# Altium footprint library ICs And Semiconductors SMD.PcbLib: 943 footprints (part 9 of 60)
Each footprint in its own frame and in the unit in brackets; x right, y up, seen from the top. Pads: shape width x height; smd on the part's side, far side on the other; paste and mask are expansions set on the pad; w line width, h text height; cw(c..) or ccw(c..) is an arc to the next point about the centre after c.
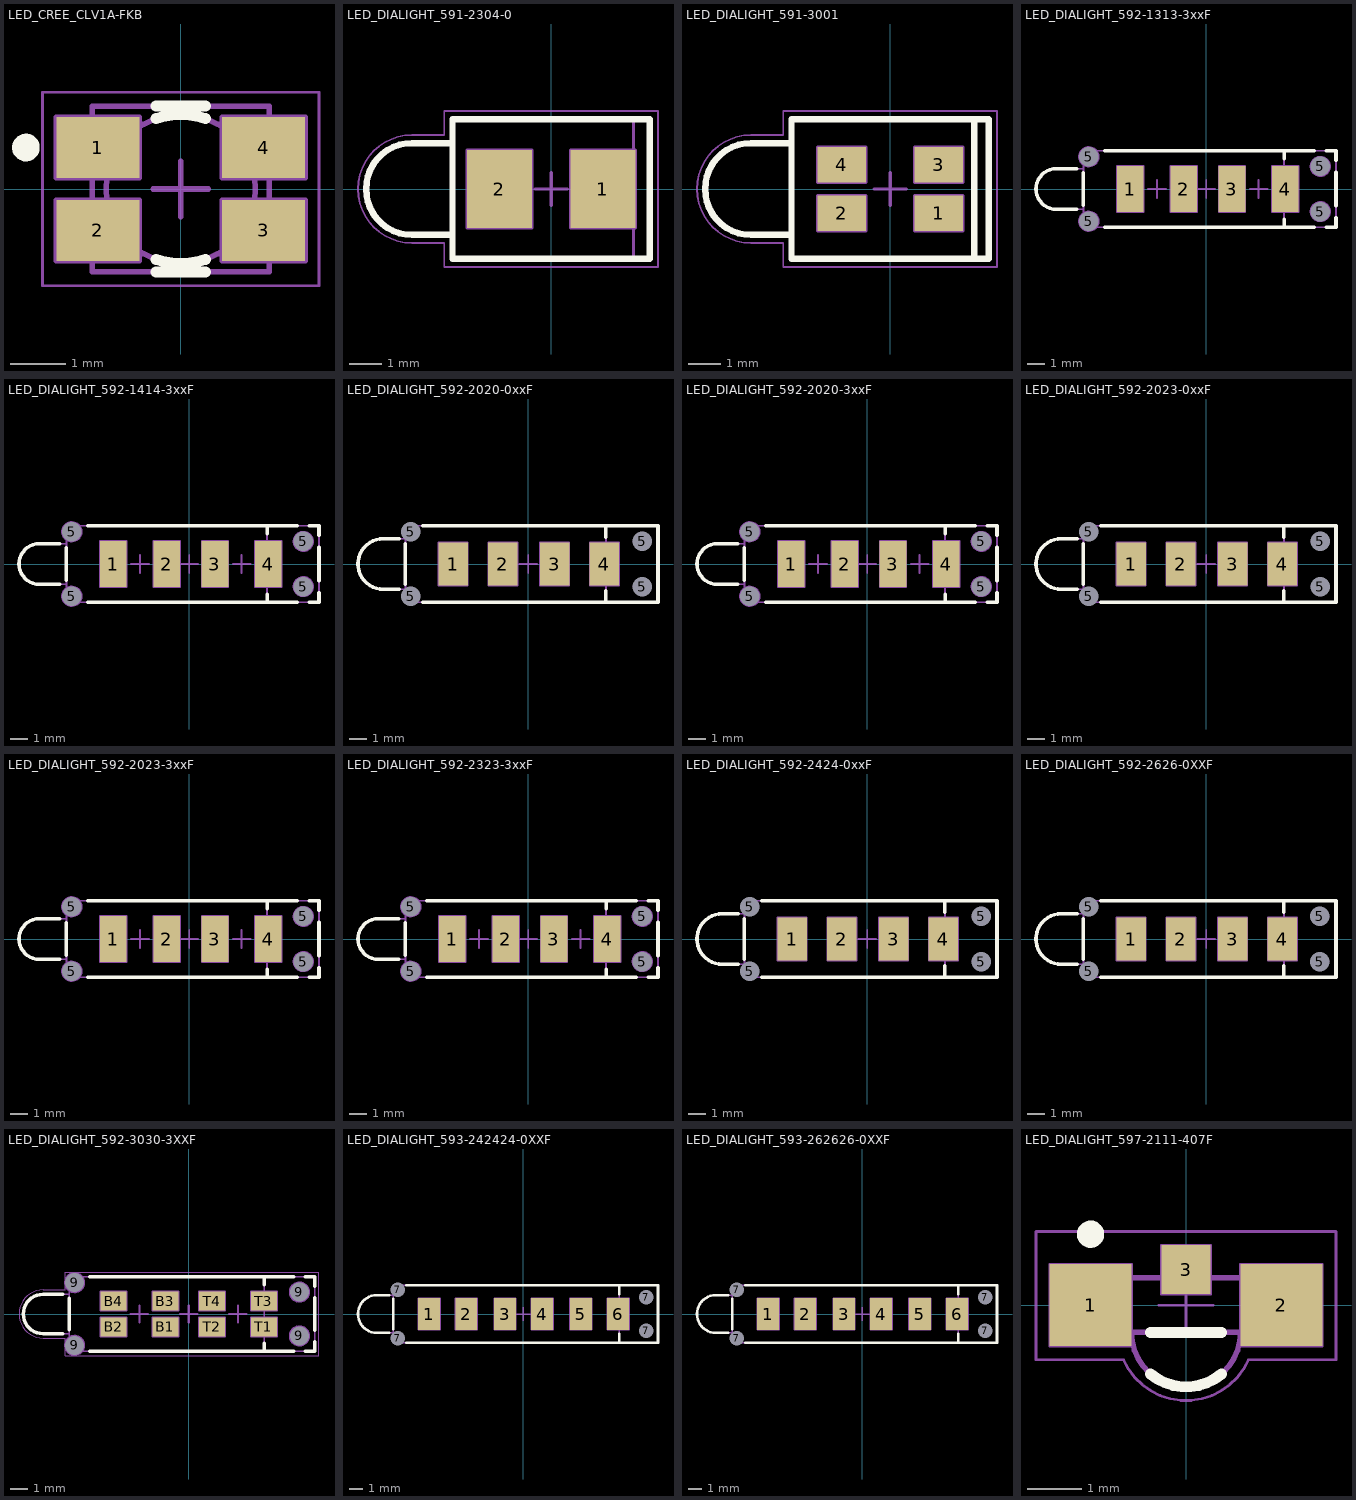
[diagram p8: the footprints below, top view; thin cyan lines are the x and y axes]

## LED_CREE_CLV1A-FKB [mm] "PLCC4 3 in 1 Surface Mount Red/Green/Blue LED With Black Top Surface, Body 3.2mm X 2.8mm"
height 2.1
pads (4):
  rect 1.5x1.1 smd: 1(-1.5,0.75) 2(-1.5,-0.75) 3(1.5,-0.75) 4(1.5,0.75)
Top Overlay:
  circle w0.25: c-2.8,0.75 r0.125
  lines w0.2: -0.45,-1.5 0.45,-1.5 ; -0.45,-1.273 ccw(c0,0) 0.45,-1.273 ; -0.45,1.273 cw(c0,0) 0.45,1.273 ; -0.45,1.5 0.45,1.5
Mechanical 8:
  lines w0.1: -2,-0.75 -1.5,-0.75 ; -2,0.75 -1.5,0.75 ; -1.5,-1.25 -1.5,-0.75 ; -1.5,-0.25 -1.5,-0.75 ; -1.5,0.25 -1.5,0.75 ; -1.5,1.25 -1.5,0.75 ; -1,-0.75 -1.5,-0.75 ; -1,0.75 -1.5,0.75 ; -0.5,0 0,0 ; 0,-0.5 0,0 ; 0,0.5 0,0 ; 0.5,0 0,0 ; 1,-0.75 1.5,-0.75 ; 1,0.75 1.5,0.75 ; 1.5,-1.25 1.5,-0.75 ; 1.5,-0.25 1.5,-0.75 ; 1.5,0.25 1.5,0.75 ; 1.5,1.25 1.5,0.75 ; 2,-0.75 1.5,-0.75 ; 2,0.75 1.5,0.75 ; -2.25,-1.3 -0.75,-1.3 -0.75,-0.2 -2.25,-0.2 -2.25,-1.3 ; -2.25,0.2 -0.75,0.2 -0.75,1.3 -2.25,1.3 -2.25,0.2 ; 0.75,-1.3 2.25,-1.3 2.25,-0.2 0.75,-0.2 0.75,-1.3 ; 0.75,0.2 2.25,0.2 2.25,1.3 0.75,1.3 0.75,0.2
Mechanical 14:
  circle w0.1: c0,0 r1.35
  lines w0.1: -1.6,-1.1 -1.85,-1.1 -1.85,-0.4 -1.6,-0.4 ; -1.6,0.4 -1.85,0.4 -1.85,1.1 -1.6,1.1 ; 1.6,-1.1 1.85,-1.1 1.85,-0.4 1.6,-0.4 ; 1.6,0.4 1.85,0.4 1.85,1.1 1.6,1.1 ; -1.6,-1.5 1.6,-1.5 1.6,1.5 -1.6,1.5 -1.6,-1.5
Mechanical 15:
  lines w0.05: -2.5,-1.75 -2.5,1.75 2.5,1.75 2.5,-1.75 -2.5,-1.75
3D body "CREE_CLV1A-FKB.stp": height 2.1, standoff 0, extent -1.85,-1.5 1.85,1.5

## LED_DIALIGHT_591-2304-0 [mm] "Surface Mount Green LED, Body 6.1mm X4.32mm"
height 5.26
pads (2):
  rect 2x2.4 smd: 1(1.6,0) 2(-1.6,0)
Top Overlay:
  lines w0.2: -3.05,-1.42 -4.3,-1.42 cw(c-4.3,0) -4.3,1.42 -3.05,1.42 ; -3.05,-2.16 3.05,-2.16 3.05,2.16 -3.05,2.16 -3.05,-2.16
Mechanical 8:
  lines w0.1: -2.1,0 -1.6,0 ; -1.6,-0.5 -1.6,0 ; -1.6,0.5 -1.6,0 ; -1.1,0 -1.6,0 ; -0.5,0 0,0 ; 0,-0.5 0,0 ; 0,0.5 0,0 ; 0.5,0 0,0 ; 1.1,0 1.6,0 ; 1.6,-0.5 1.6,0 ; 1.6,0.5 1.6,0 ; 2.1,0 1.6,0 ; -2.6,-1.2 -0.6,-1.2 -0.6,1.2 -2.6,1.2 -2.6,-1.2 ; 0.6,-1.2 2.6,-1.2 2.6,1.2 0.6,1.2 0.6,-1.2
Mechanical 14:
  lines w0.1: -3.05,-1.42 -4.3,-1.42 cw(c-4.3,0) -4.3,1.42 -3.05,1.42 ; 2.542,-2.16 2.542,2.16 ; -3.05,-2.16 3.05,-2.16 3.05,2.16 -3.05,2.16 -3.05,-2.16
Mechanical 15:
  lines w0.05: -4.3,-1.67 cw(c-4.3,0) -4.3,1.67 -3.3,1.67 -3.3,2.41 3.3,2.41 3.3,-2.41 -3.3,-2.41 -3.3,-1.67 -4.3,-1.67
3D body "LED_DIALIGHT_591-2304-0.stp": height 5.26, standoff 0, extent -5.72,-2.16 3.05,2.16

## LED_DIALIGHT_591-3001 [mm] "Surface Mount Red/Green LED, Body 6.1mm X4.32mm"
height 5.26
pads (4):
  rect 1.5x1.09 smd: 1(1.5,-0.75) 2(-1.5,-0.75) 3(1.5,0.75) 4(-1.5,0.75)
Top Overlay:
  lines w0.2: -3.05,-1.42 -4.3,-1.42 cw(c-4.3,0) -4.3,1.42 -3.05,1.42 ; 2.592,-2.16 2.592,2.16 ; -3.05,-2.16 3.05,-2.16 3.05,2.16 -3.05,2.16 -3.05,-2.16
Mechanical 8:
  lines w0.1: -2,-0.75 -1.5,-0.75 ; -2,0.75 -1.5,0.75 ; -1.5,-1.25 -1.5,-0.75 ; -1.5,-0.25 -1.5,-0.75 ; -1.5,0.25 -1.5,0.75 ; -1.5,1.25 -1.5,0.75 ; -1,-0.75 -1.5,-0.75 ; -1,0.75 -1.5,0.75 ; -0.5,0 0,0 ; 0,-0.5 0,0 ; 0,0.5 0,0 ; 0.5,0 0,0 ; 1,-0.75 1.5,-0.75 ; 1,0.75 1.5,0.75 ; 1.5,-1.25 1.5,-0.75 ; 1.5,-0.25 1.5,-0.75 ; 1.5,0.25 1.5,0.75 ; 1.5,1.25 1.5,0.75 ; 2,-0.75 1.5,-0.75 ; 2,0.75 1.5,0.75 ; 2.25,-1.295 2.25,-0.205 ; 2.25,-1.295 0.75,-1.295 0.75,-0.205 2.25,-0.205 ; 2.25,-1.295 2.25,-0.205 ; 2.25,0.205 2.25,1.295 ; 2.25,0.205 0.75,0.205 0.75,1.295 2.25,1.295 ; 2.25,0.205 2.25,1.295 ; -2.25,-1.295 -2.25,-0.205 -0.75,-0.205 -0.75,-1.295 -2.25,-1.295 ; -2.25,0.205 -0.75,0.205 -0.75,1.295 -2.25,1.295 -2.25,0.205
Mechanical 14:
  lines w0.1: -3.05,-1.42 -4.3,-1.42 cw(c-4.3,0) -4.3,1.42 -3.05,1.42 ; 2.542,-2.16 2.542,2.16 ; -3.05,-2.16 3.05,-2.16 3.05,2.16 -3.05,2.16 -3.05,-2.16
Mechanical 15:
  lines w0.05: -4.3,-1.67 cw(c-4.3,0) -4.3,1.67 -3.3,1.67 -3.3,2.41 3.3,2.41 3.3,-2.41 -3.3,-2.41 -3.3,-1.67 -4.3,-1.67
3D body "LED_DIALIGHT_591-3001.stp": height 5.26, standoff 0, extent -5.72,-2.16 3.05,2.16

## LED_DIALIGHT_592-1313-3xxF [mm] "3mm Bi-Level (Top: Green, Bot: Green) Prism CBI Bi-color Surface Mount LED 592 Serie"
height 10.29
pads (8):
  rect 1.5x2.59 smd: 1(-4.275,0) 2(-1.275,0) 3(1.445,0) 4(4.445,0)
  round 1 hole 1.1 unplated mask+0.05: 5(-6.615,-1.815) 5(-6.615,1.815) 5(6.415,-1.27) 5(6.415,1.27)
Top Overlay:
  lines w0.2: -7.287,-1.143 -8.446,-1.143 cw(c-8.446,0) -8.446,1.143 -7.287,1.143 ; -6.922,-0.916 -6.922,0.916 ; -5.729,-2.159 6.08,-2.159 ; -5.729,2.159 6.08,2.159 ; 4.382,-2.159 4.382,-1.695 ; 4.382,1.695 4.382,2.159 ; 6.75,-2.159 7.303,-2.159 7.303,-1.609 ; 6.75,2.159 7.303,2.159 7.303,1.609 ; 7.303,-0.931 7.303,0.931
Mechanical 8:
  circle w0.1: c-6.615,1.815 r0.55
  circle w0.1: c-6.615,-1.815 r0.55
  circle w0.1: c6.415,-1.27 r0.55
  circle w0.1: c6.415,1.27 r0.55
  lines w0.1: -7.115,-1.815 -6.615,-1.815 ; -7.115,1.815 -6.615,1.815 ; -6.615,-2.315 -6.615,-1.815 ; -6.615,-1.315 -6.615,-1.815 ; -6.615,1.315 -6.615,1.815 ; -6.615,2.315 -6.615,1.815 ; -6.115,-1.815 -6.615,-1.815 ; -6.115,1.815 -6.615,1.815 ; -4.275,-0.5 -4.275,0 ; -4.275,0.5 -4.275,0 ; -2.775,-0.5 -2.775,0 ; -2.775,0.5 -2.775,0 ; -1.275,-0.5 -1.275,0 ; -1.275,0.5 -1.275,0 ; -0.5,0 0,0 ; 0,-0.5 0,0 ; 0,0.5 0,0 ; 0.5,0 0,0 ; 1.445,-0.5 1.445,0 ; 1.445,0.5 1.445,0 ; 2.945,-0.5 2.945,0 ; 2.945,0.5 2.945,0 ; 4.445,-0.5 4.445,0 ; 4.445,0.5 4.445,0 ; 5.915,-1.27 6.415,-1.27 ; 5.915,1.27 6.415,1.27 ; 6.415,-1.77 6.415,-1.27 ; 6.415,-0.77 6.415,-1.27 ; 6.415,0.77 6.415,1.27 ; 6.415,1.77 6.415,1.27 ; 6.915,-1.27 6.415,-1.27 ; 6.915,1.27 6.415,1.27 ; -4.275,0 -4.775,0 -4.275,0 ; -4.275,0 -3.775,0 -4.275,0 ; -2.775,0 -3.275,0 -2.775,0 ; -2.775,0 -2.275,0 -2.775,0 ; -1.275,0 -1.775,0 -1.275,0 ; -1.275,0 -0.775,0 -1.275,0 ; 1.445,0 0.945,0 1.445,0 ; 1.445,0 1.945,0 1.445,0 ; 2.945,0 2.445,0 2.945,0 ; 2.945,0 3.445,0 2.945,0 ; 4.445,0 3.945,0 4.445,0 ; 4.445,0 4.945,0 4.445,0 ; -5.025,-1.295 -3.525,-1.295 -3.525,1.295 -5.025,1.295 -5.025,-1.295 ; -2.025,-1.295 -0.525,-1.295 -0.525,1.295 -2.025,1.295 -2.025,-1.295 ; 0.695,-1.295 2.195,-1.295 2.195,1.295 0.695,1.295 0.695,-1.295 ; 3.695,-1.295 5.195,-1.295 5.195,1.295 3.695,1.295 3.695,-1.295
Mechanical 14:
  lines w0.1: -6.922,-1.143 -8.446,-1.143 cw(c-8.446,0) -8.446,1.143 -6.922,1.143 ; 4.382,-2.159 4.382,2.159 ; -6.922,-2.159 7.303,-2.159 7.303,2.159 -6.922,2.159 -6.922,-2.159
3D body "LED_DIALIGHT_592-3030-3xxF.stp": height 10.41, standoff -1.14, extent -9.588,-2.159 7.303,2.159

## LED_DIALIGHT_592-1414-3xxF [mm] "3mm Bi-Level (Top: Yelow, Bot: Yelow) Prism CBI Bi-color Surface Mount LED 592 Serie"
height 10.29
pads (8):
  rect 1.5x2.59 smd: 1(-4.275,0) 2(-1.275,0) 3(1.445,0) 4(4.445,0)
  round 1 hole 1.1 unplated mask+0.05: 5(-6.615,-1.815) 5(-6.615,1.815) 5(6.415,-1.27) 5(6.415,1.27)
Top Overlay:
  lines w0.2: -7.287,-1.143 -8.446,-1.143 cw(c-8.446,0) -8.446,1.143 -7.287,1.143 ; -6.922,-0.916 -6.922,0.916 ; -5.729,-2.159 6.08,-2.159 ; -5.729,2.159 6.08,2.159 ; 4.382,-2.159 4.382,-1.695 ; 4.382,1.695 4.382,2.159 ; 6.75,-2.159 7.303,-2.159 7.303,-1.609 ; 6.75,2.159 7.303,2.159 7.303,1.609 ; 7.303,-0.931 7.303,0.931
Mechanical 8:
  circle w0.1: c6.415,1.27 r0.55
  circle w0.1: c6.415,-1.27 r0.55
  circle w0.1: c-6.615,-1.815 r0.55
  circle w0.1: c-6.615,1.815 r0.55
  lines w0.1: -7.115,-1.815 -6.615,-1.815 ; -7.115,1.815 -6.615,1.815 ; -6.615,-2.315 -6.615,-1.815 ; -6.615,-1.315 -6.615,-1.815 ; -6.615,1.315 -6.615,1.815 ; -6.615,2.315 -6.615,1.815 ; -6.115,-1.815 -6.615,-1.815 ; -6.115,1.815 -6.615,1.815 ; -4.275,-0.5 -4.275,0 ; -4.275,0.5 -4.275,0 ; -2.775,-0.5 -2.775,0 ; -2.775,0.5 -2.775,0 ; -1.275,-0.5 -1.275,0 ; -1.275,0.5 -1.275,0 ; -0.5,0 0,0 ; 0,-0.5 0,0 ; 0,0.5 0,0 ; 0.5,0 0,0 ; 1.445,-0.5 1.445,0 ; 1.445,0.5 1.445,0 ; 2.945,-0.5 2.945,0 ; 2.945,0.5 2.945,0 ; 4.445,-0.5 4.445,0 ; 4.445,0.5 4.445,0 ; 5.915,-1.27 6.415,-1.27 ; 5.915,1.27 6.415,1.27 ; 6.415,-1.77 6.415,-1.27 ; 6.415,-0.77 6.415,-1.27 ; 6.415,0.77 6.415,1.27 ; 6.415,1.77 6.415,1.27 ; 6.915,-1.27 6.415,-1.27 ; 6.915,1.27 6.415,1.27 ; -4.275,0 -3.775,0 -4.275,0 ; -4.275,0 -4.775,0 -4.275,0 ; -2.775,0 -2.275,0 -2.775,0 ; -2.775,0 -3.275,0 -2.775,0 ; -1.275,0 -0.775,0 -1.275,0 ; -1.275,0 -1.775,0 -1.275,0 ; 1.445,0 1.945,0 1.445,0 ; 1.445,0 0.945,0 1.445,0 ; 2.945,0 3.445,0 2.945,0 ; 2.945,0 2.445,0 2.945,0 ; 4.445,0 4.945,0 4.445,0 ; 4.445,0 3.945,0 4.445,0 ; -5.025,-1.295 -5.025,1.295 -3.525,1.295 -3.525,-1.295 -5.025,-1.295 ; -2.025,-1.295 -2.025,1.295 -0.525,1.295 -0.525,-1.295 -2.025,-1.295 ; 0.695,-1.295 0.695,1.295 2.195,1.295 2.195,-1.295 0.695,-1.295 ; 3.695,-1.295 3.695,1.295 5.195,1.295 5.195,-1.295 3.695,-1.295
Mechanical 14:
  lines w0.1: -6.922,-1.143 -8.446,-1.143 cw(c-8.446,0) -8.446,1.143 -6.922,1.143 ; 4.382,-2.159 4.382,2.159 ; -6.922,-2.159 -6.922,2.159 7.303,2.159 7.303,-2.159 -6.922,-2.159
3D body "LED_DIALIGHT_592-1414-3xxF.stp": height 10.41, standoff -1.14, extent -9.588,-2.159 7.303,2.159

## LED_DIALIGHT_592-2020-0xxF [mil] "3mm Bi-Level (Top: HeRed, Bot: HeRed) Prism CBI Bi-color Surface Mount LED 592 Serie"
height 389.76
pads (8):
  rect 65x95 smd: 1(-166.5,0) 2(-56.5,0) 3(58.5,0) 4(168.5,0)
  round 39.37 hole 43.31 unplated mask+1.97: 5(-260.5,-71.5) 5(-260.5,71.5) 5(252.49,-50) 5(252.49,50)
Top Overlay:
  lines w7.87: -285.63,-56 -321.5,-56 cw(c-321.5,0) -321.5,56 -285.63,56 ; -272.5,-44.52 -272.5,44.52 ; -234.24,-85 287.5,-85 287.5,85 -234.24,85 ; 172.03,-85 172.03,-59.31 ; 172.03,59.31 172.03,85
Mechanical 8:
  lines w3.94: -280.19,-71.5 -260.5,-71.5 ; -280.19,71.5 -260.5,71.5 ; -260.5,-91.19 -260.5,-71.5 ; -260.5,-51.81 -260.5,-71.5 ; -260.5,51.81 -260.5,71.5 ; -260.5,91.19 -260.5,71.5 ; -240.82,-71.5 -260.5,-71.5 ; -240.82,71.5 -260.5,71.5 ; -186.19,0 -166.5,0 ; -166.5,-19.69 -166.5,0 ; -166.5,19.69 -166.5,0 ; -146.81,0 -166.5,0 ; -76.19,0 -56.5,0 ; -56.5,-19.69 -56.5,0 ; -56.5,19.69 -56.5,0 ; -36.81,0 -56.5,0 ; -19.68,0 0,0 ; 0,-19.68 0,0 ; 0,19.68 0,0 ; 19.68,0 0,0 ; 38.81,0 58.5,0 ; 58.5,-19.69 58.5,0 ; 58.5,19.69 58.5,0 ; 78.19,0 58.5,0 ; 148.81,0 168.5,0 ; 168.5,-19.69 168.5,0 ; 168.5,19.69 168.5,0 ; 188.19,0 168.5,0 ; 232.81,-50 252.49,-50 ; 232.81,50 252.49,50 ; 252.49,-69.69 252.49,-50 ; 252.49,-30.32 252.49,-50 ; 252.49,30.32 252.49,50 ; 252.49,69.69 252.49,50 ; 272.18,-50 252.49,-50 ; 272.18,50 252.49,50 ; -199,-47.5 -199,47.5 -134,47.5 -134,-47.5 -199,-47.5 ; -89,-47.5 -89,47.5 -24,47.5 -24,-47.5 -89,-47.5 ; 26,-47.5 26,47.5 91,47.5 91,-47.5 26,-47.5 ; 136,-47.5 136,47.5 201,47.5 201,-47.5 136,-47.5
Mechanical 14:
  lines w3.94: -272.5,-56 -321.5,-56 cw(c-321.5,0) -321.5,56 -272.5,56 ; 172.03,-85 172.03,85 ; -272.5,-85 -272.5,85 287.5,85 287.5,-85 -272.5,-85
3D body "LED_DIALIGHT_592-2020-0xxF.stp": height 390, standoff -40, extent -377.49,-84.99 287.51,85.01

## LED_DIALIGHT_592-2020-3xxF [mm] "3mm Bi-Level (Top: Red, Bot: Red) Prism CBI Bi-color Surface Mount LED 592 Serie"
height 10.55
pads (8):
  rect 1.5x2.59 smd: 1(-4.275,0) 2(-1.275,0) 3(1.445,0) 4(4.445,0)
  round 1 hole 1.1 unplated mask+0.05: 5(-6.615,-1.815) 5(-6.615,1.815) 5(6.415,-1.27) 5(6.415,1.27)
Top Overlay:
  lines w0.2: -7.287,-1.143 -8.446,-1.143 cw(c-8.446,0) -8.446,1.143 -7.287,1.143 ; -6.922,-0.916 -6.922,0.916 ; -5.729,-2.159 6.08,-2.159 ; -5.729,2.159 6.08,2.159 ; 4.382,-2.159 4.382,-1.695 ; 4.382,1.695 4.382,2.159 ; 6.75,-2.159 7.303,-2.159 7.303,-1.609 ; 6.75,2.159 7.303,2.159 7.303,1.609 ; 7.303,-0.931 7.303,0.931
Mechanical 8:
  circle w0.1: c6.415,1.27 r0.55
  circle w0.1: c6.415,-1.27 r0.55
  circle w0.1: c-6.615,-1.815 r0.55
  circle w0.1: c-6.615,1.815 r0.55
  lines w0.1: -7.115,-1.815 -6.615,-1.815 ; -7.115,1.815 -6.615,1.815 ; -6.615,-2.315 -6.615,-1.815 ; -6.615,-1.315 -6.615,-1.815 ; -6.615,1.315 -6.615,1.815 ; -6.615,2.315 -6.615,1.815 ; -6.115,-1.815 -6.615,-1.815 ; -6.115,1.815 -6.615,1.815 ; -4.275,-0.5 -4.275,0 ; -4.275,0.5 -4.275,0 ; -2.775,-0.5 -2.775,0 ; -2.775,0.5 -2.775,0 ; -1.275,-0.5 -1.275,0 ; -1.275,0.5 -1.275,0 ; -0.5,0 0,0 ; 0,-0.5 0,0 ; 0,0.5 0,0 ; 0.5,0 0,0 ; 1.445,-0.5 1.445,0 ; 1.445,0.5 1.445,0 ; 2.945,-0.5 2.945,0 ; 2.945,0.5 2.945,0 ; 4.445,-0.5 4.445,0 ; 4.445,0.5 4.445,0 ; 5.915,-1.27 6.415,-1.27 ; 5.915,1.27 6.415,1.27 ; 6.415,-1.77 6.415,-1.27 ; 6.415,-0.77 6.415,-1.27 ; 6.415,0.77 6.415,1.27 ; 6.415,1.77 6.415,1.27 ; 6.915,-1.27 6.415,-1.27 ; 6.915,1.27 6.415,1.27 ; -4.275,0 -3.775,0 -4.275,0 ; -4.275,0 -4.775,0 -4.275,0 ; -2.775,0 -2.275,0 -2.775,0 ; -2.775,0 -3.275,0 -2.775,0 ; -1.275,0 -0.775,0 -1.275,0 ; -1.275,0 -1.775,0 -1.275,0 ; 1.445,0 1.945,0 1.445,0 ; 1.445,0 0.945,0 1.445,0 ; 2.945,0 3.445,0 2.945,0 ; 2.945,0 2.445,0 2.945,0 ; 4.445,0 4.945,0 4.445,0 ; 4.445,0 3.945,0 4.445,0 ; -5.025,-1.295 -5.025,1.295 -3.525,1.295 -3.525,-1.295 -5.025,-1.295 ; -2.025,-1.295 -2.025,1.295 -0.525,1.295 -0.525,-1.295 -2.025,-1.295 ; 0.695,-1.295 0.695,1.295 2.195,1.295 2.195,-1.295 0.695,-1.295 ; 3.695,-1.295 3.695,1.295 5.195,1.295 5.195,-1.295 3.695,-1.295
Mechanical 14:
  lines w0.1: -6.922,-1.143 -8.446,-1.143 cw(c-8.446,0) -8.446,1.143 -6.922,1.143 ; 4.382,-2.159 4.382,2.159 ; -6.922,-2.159 -6.922,2.159 7.303,2.159 7.303,-2.159 -6.922,-2.159
3D body "LED_DIALIGHT_592-2020-3xxF.stp": height 10.41, standoff -1.14, extent -9.588,-2.159 7.303,2.159

## LED_DIALIGHT_592-2023-0xxF [mil] "3mm Bi-Level (Top: HeRed, Bot: Green) Prism CBI Bi-color Surface Mount LED 592 Serie"
height 389.76
pads (8):
  rect 65x95 smd: 1(-166.5,0) 2(-56.5,0) 3(58.5,0) 4(168.5,0)
  round 39.37 hole 43.31 unplated mask+1.97: 5(-260.5,-71.5) 5(-260.5,71.5) 5(252.49,-50) 5(252.49,50)
Top Overlay:
  lines w7.87: -285.63,-56 -321.5,-56 cw(c-321.5,0) -321.5,56 -285.63,56 ; -272.5,-44.52 -272.5,44.52 ; -234.24,-85 287.5,-85 287.5,85 -234.24,85 ; 172.03,-85 172.03,-59.31 ; 172.03,59.31 172.03,85
Mechanical 8:
  lines w3.94: -280.19,-71.5 -260.5,-71.5 ; -280.19,71.5 -260.5,71.5 ; -260.5,-91.19 -260.5,-71.5 ; -260.5,-51.81 -260.5,-71.5 ; -260.5,51.81 -260.5,71.5 ; -260.5,91.19 -260.5,71.5 ; -240.82,-71.5 -260.5,-71.5 ; -240.82,71.5 -260.5,71.5 ; -186.19,0 -166.5,0 ; -166.5,-19.69 -166.5,0 ; -166.5,19.69 -166.5,0 ; -146.81,0 -166.5,0 ; -76.19,0 -56.5,0 ; -56.5,-19.69 -56.5,0 ; -56.5,19.69 -56.5,0 ; -36.81,0 -56.5,0 ; -19.68,0 0,0 ; 0,-19.68 0,0 ; 0,19.68 0,0 ; 19.68,0 0,0 ; 38.81,0 58.5,0 ; 58.5,-19.69 58.5,0 ; 58.5,19.69 58.5,0 ; 78.19,0 58.5,0 ; 148.81,0 168.5,0 ; 168.5,-19.69 168.5,0 ; 168.5,19.69 168.5,0 ; 188.19,0 168.5,0 ; 232.81,-50 252.49,-50 ; 232.81,50 252.49,50 ; 252.49,-69.69 252.49,-50 ; 252.49,-30.32 252.49,-50 ; 252.49,30.32 252.49,50 ; 252.49,69.69 252.49,50 ; 272.18,-50 252.49,-50 ; 272.18,50 252.49,50 ; -199,-47.5 -199,47.5 -134,47.5 -134,-47.5 -199,-47.5 ; -89,-47.5 -89,47.5 -24,47.5 -24,-47.5 -89,-47.5 ; 26,-47.5 26,47.5 91,47.5 91,-47.5 26,-47.5 ; 136,-47.5 136,47.5 201,47.5 201,-47.5 136,-47.5
Mechanical 14:
  lines w3.94: -272.5,-56 -321.5,-56 cw(c-321.5,0) -321.5,56 -272.5,56 ; 172.03,-85 172.03,85 ; -272.5,-85 -272.5,85 287.5,85 287.5,-85 -272.5,-85
3D body "LED_DIALIGHT_592-2023-0xxF.stp": height 390, standoff -40, extent -377.49,-84.99 287.51,85

## LED_DIALIGHT_592-2023-3xxF [mm] "3mm Bi-Level (Top: Red, Bot: Green) Prism CBI Bi-color Surface Mount LED 592 Serie"
height 10.55
pads (8):
  rect 1.5x2.59 smd: 1(-4.275,0) 2(-1.275,0) 3(1.445,0) 4(4.445,0)
  round 1 hole 1.1 unplated mask+0.05: 5(-6.615,-1.815) 5(-6.615,1.815) 5(6.415,-1.27) 5(6.415,1.27)
Top Overlay:
  lines w0.2: -7.287,-1.143 -8.446,-1.143 cw(c-8.446,0) -8.446,1.143 -7.287,1.143 ; -6.922,-0.916 -6.922,0.916 ; -5.729,-2.159 6.08,-2.159 ; -5.729,2.159 6.08,2.159 ; 4.382,-2.159 4.382,-1.695 ; 4.382,1.695 4.382,2.159 ; 6.75,-2.159 7.303,-2.159 7.303,-1.609 ; 6.75,2.159 7.303,2.159 7.303,1.609 ; 7.303,-0.931 7.303,0.931
Mechanical 8:
  circle w0.1: c-6.615,1.815 r0.55
  circle w0.1: c-6.615,-1.815 r0.55
  circle w0.1: c6.415,-1.27 r0.55
  circle w0.1: c6.415,1.27 r0.55
  lines w0.1: -7.115,-1.815 -6.615,-1.815 ; -7.115,1.815 -6.615,1.815 ; -6.615,-2.315 -6.615,-1.815 ; -6.615,-1.315 -6.615,-1.815 ; -6.615,1.315 -6.615,1.815 ; -6.615,2.315 -6.615,1.815 ; -6.115,-1.815 -6.615,-1.815 ; -6.115,1.815 -6.615,1.815 ; -4.275,-0.5 -4.275,0 ; -4.275,0.5 -4.275,0 ; -2.775,-0.5 -2.775,0 ; -2.775,0.5 -2.775,0 ; -1.275,-0.5 -1.275,0 ; -1.275,0.5 -1.275,0 ; -0.5,0 0,0 ; 0,-0.5 0,0 ; 0,0.5 0,0 ; 0.5,0 0,0 ; 1.445,-0.5 1.445,0 ; 1.445,0.5 1.445,0 ; 2.945,-0.5 2.945,0 ; 2.945,0.5 2.945,0 ; 4.445,-0.5 4.445,0 ; 4.445,0.5 4.445,0 ; 5.915,-1.27 6.415,-1.27 ; 5.915,1.27 6.415,1.27 ; 6.415,-1.77 6.415,-1.27 ; 6.415,-0.77 6.415,-1.27 ; 6.415,0.77 6.415,1.27 ; 6.415,1.77 6.415,1.27 ; 6.915,-1.27 6.415,-1.27 ; 6.915,1.27 6.415,1.27 ; -4.275,0 -4.775,0 -4.275,0 ; -4.275,0 -3.775,0 -4.275,0 ; -2.775,0 -3.275,0 -2.775,0 ; -2.775,0 -2.275,0 -2.775,0 ; -1.275,0 -1.775,0 -1.275,0 ; -1.275,0 -0.775,0 -1.275,0 ; 1.445,0 0.945,0 1.445,0 ; 1.445,0 1.945,0 1.445,0 ; 2.945,0 2.445,0 2.945,0 ; 2.945,0 3.445,0 2.945,0 ; 4.445,0 3.945,0 4.445,0 ; 4.445,0 4.945,0 4.445,0 ; -5.025,-1.295 -3.525,-1.295 -3.525,1.295 -5.025,1.295 -5.025,-1.295 ; -2.025,-1.295 -0.525,-1.295 -0.525,1.295 -2.025,1.295 -2.025,-1.295 ; 0.695,-1.295 2.195,-1.295 2.195,1.295 0.695,1.295 0.695,-1.295 ; 3.695,-1.295 5.195,-1.295 5.195,1.295 3.695,1.295 3.695,-1.295
Mechanical 14:
  lines w0.1: -6.922,-1.143 -8.446,-1.143 cw(c-8.446,0) -8.446,1.143 -6.922,1.143 ; 4.382,-2.159 4.382,2.159 ; -6.922,-2.159 7.303,-2.159 7.303,2.159 -6.922,2.159 -6.922,-2.159
3D body "LED_DIALIGHT_592-2023-3xxF.stp": height 10.41, standoff -1.14, extent -9.588,-2.159 7.303,2.159

## LED_DIALIGHT_592-2323-3xxF [mm] "3mm Bi-Level (Top: Green, Bot: Green) Prism CBI Bi-color Surface Mount LED 592 Serie"
height 10.55
pads (8):
  rect 1.5x2.59 smd: 1(-4.275,0) 2(-1.275,0) 3(1.445,0) 4(4.445,0)
  round 1 hole 1.1 unplated mask+0.05: 5(-6.615,-1.815) 5(-6.615,1.815) 5(6.415,-1.27) 5(6.415,1.27)
Top Overlay:
  lines w0.2: -7.287,-1.143 -8.446,-1.143 cw(c-8.446,0) -8.446,1.143 -7.287,1.143 ; -6.922,-0.916 -6.922,0.916 ; -5.729,-2.159 6.08,-2.159 ; -5.729,2.159 6.08,2.159 ; 4.382,-2.159 4.382,-1.695 ; 4.382,1.695 4.382,2.159 ; 6.75,-2.159 7.303,-2.159 7.303,-1.609 ; 6.75,2.159 7.303,2.159 7.303,1.609 ; 7.303,-0.931 7.303,0.931
Mechanical 8:
  circle w0.1: c-6.615,1.815 r0.55
  circle w0.1: c-6.615,-1.815 r0.55
  circle w0.1: c6.415,-1.27 r0.55
  circle w0.1: c6.415,1.27 r0.55
  lines w0.1: -7.115,-1.815 -6.615,-1.815 ; -7.115,1.815 -6.615,1.815 ; -6.615,-2.315 -6.615,-1.815 ; -6.615,-1.315 -6.615,-1.815 ; -6.615,1.315 -6.615,1.815 ; -6.615,2.315 -6.615,1.815 ; -6.115,-1.815 -6.615,-1.815 ; -6.115,1.815 -6.615,1.815 ; -4.275,-0.5 -4.275,0 ; -4.275,0.5 -4.275,0 ; -2.775,-0.5 -2.775,0 ; -2.775,0.5 -2.775,0 ; -1.275,-0.5 -1.275,0 ; -1.275,0.5 -1.275,0 ; -0.5,0 0,0 ; 0,-0.5 0,0 ; 0,0.5 0,0 ; 0.5,0 0,0 ; 1.445,-0.5 1.445,0 ; 1.445,0.5 1.445,0 ; 2.945,-0.5 2.945,0 ; 2.945,0.5 2.945,0 ; 4.445,-0.5 4.445,0 ; 4.445,0.5 4.445,0 ; 5.915,-1.27 6.415,-1.27 ; 5.915,1.27 6.415,1.27 ; 6.415,-1.77 6.415,-1.27 ; 6.415,-0.77 6.415,-1.27 ; 6.415,0.77 6.415,1.27 ; 6.415,1.77 6.415,1.27 ; 6.915,-1.27 6.415,-1.27 ; 6.915,1.27 6.415,1.27 ; -4.275,0 -4.775,0 -4.275,0 ; -4.275,0 -3.775,0 -4.275,0 ; -2.775,0 -3.275,0 -2.775,0 ; -2.775,0 -2.275,0 -2.775,0 ; -1.275,0 -1.775,0 -1.275,0 ; -1.275,0 -0.775,0 -1.275,0 ; 1.445,0 0.945,0 1.445,0 ; 1.445,0 1.945,0 1.445,0 ; 2.945,0 2.445,0 2.945,0 ; 2.945,0 3.445,0 2.945,0 ; 4.445,0 3.945,0 4.445,0 ; 4.445,0 4.945,0 4.445,0 ; -5.025,-1.295 -3.525,-1.295 -3.525,1.295 -5.025,1.295 -5.025,-1.295 ; -2.025,-1.295 -0.525,-1.295 -0.525,1.295 -2.025,1.295 -2.025,-1.295 ; 0.695,-1.295 2.195,-1.295 2.195,1.295 0.695,1.295 0.695,-1.295 ; 3.695,-1.295 5.195,-1.295 5.195,1.295 3.695,1.295 3.695,-1.295
Mechanical 14:
  lines w0.1: -6.922,-1.143 -8.446,-1.143 cw(c-8.446,0) -8.446,1.143 -6.922,1.143 ; 4.382,-2.159 4.382,2.159 ; -6.922,-2.159 7.303,-2.159 7.303,2.159 -6.922,2.159 -6.922,-2.159
3D body "LED_DIALIGHT_592-2323-3xxF.stp": height 10.41, standoff -1.14, extent -9.588,-2.159 7.303,2.159

## LED_DIALIGHT_592-2424-0xxF [mil] "3mm Bi-Level (Top: Yellow, Bot: Yellow) Prism CBI Bi-color Surface Mount LED 592 Serie"
height 389.76
pads (8):
  rect 65x95 smd: 1(-166.5,0) 2(-56.5,0) 3(58.5,0) 4(168.5,0)
  round 39.37 hole 43.31 unplated mask+1.97: 5(-260.5,-71.5) 5(-260.5,71.5) 5(252.49,-50) 5(252.49,50)
Top Overlay:
  lines w7.87: -285.63,-56 -321.5,-56 cw(c-321.5,0) -321.5,56 -285.63,56 ; -272.5,-44.52 -272.5,44.52 ; -234.24,-85 287.5,-85 287.5,85 -234.24,85 ; 172.03,-85 172.03,-59.31 ; 172.03,59.31 172.03,85
Mechanical 8:
  lines w3.94: -280.19,-71.5 -260.5,-71.5 ; -280.19,71.5 -260.5,71.5 ; -260.5,-91.19 -260.5,-71.5 ; -260.5,-51.81 -260.5,-71.5 ; -260.5,51.81 -260.5,71.5 ; -260.5,91.19 -260.5,71.5 ; -240.82,-71.5 -260.5,-71.5 ; -240.82,71.5 -260.5,71.5 ; -186.19,0 -166.5,0 ; -166.5,-19.69 -166.5,0 ; -166.5,19.69 -166.5,0 ; -146.81,0 -166.5,0 ; -76.19,0 -56.5,0 ; -56.5,-19.69 -56.5,0 ; -56.5,19.69 -56.5,0 ; -36.81,0 -56.5,0 ; -19.68,0 0,0 ; 0,-19.68 0,0 ; 0,19.68 0,0 ; 19.68,0 0,0 ; 38.81,0 58.5,0 ; 58.5,-19.69 58.5,0 ; 58.5,19.69 58.5,0 ; 78.19,0 58.5,0 ; 148.81,0 168.5,0 ; 168.5,-19.69 168.5,0 ; 168.5,19.69 168.5,0 ; 188.19,0 168.5,0 ; 232.81,-50 252.49,-50 ; 232.81,50 252.49,50 ; 252.49,-69.69 252.49,-50 ; 252.49,-30.32 252.49,-50 ; 252.49,30.32 252.49,50 ; 252.49,69.69 252.49,50 ; 272.18,-50 252.49,-50 ; 272.18,50 252.49,50 ; -199,-47.5 -134,-47.5 -134,47.5 -199,47.5 -199,-47.5 ; -89,-47.5 -24,-47.5 -24,47.5 -89,47.5 -89,-47.5 ; 26,-47.5 91,-47.5 91,47.5 26,47.5 26,-47.5 ; 136,-47.5 201,-47.5 201,47.5 136,47.5 136,-47.5
Mechanical 14:
  lines w3.94: -272.5,-56 -321.5,-56 cw(c-321.5,0) -321.5,56 -272.5,56 ; 172.03,-85 172.03,85 ; -272.5,-85 287.5,-85 287.5,85 -272.5,85 -272.5,-85
3D body "LED_DIALIGHT_592-2424-0xxF.stp": height 390, standoff -40, extent -377.5,-85 287.5,85

## LED_DIALIGHT_592-2626-0XXF [mil] "Blue 3mm Bi-Level Prism CBI Surface Mount LED DIALIGHT 592 Serie"
height 389.76
pads (8):
  rect 65x95 smd: 1(-166.5,0) 2(-56.5,0) 3(58.5,0) 4(168.5,0)
  round 39.37 hole 43.31 unplated mask+1.97: 5(-260.5,-71.5) 5(-260.5,71.5) 5(251.31,-50) 5(251.31,50)
Top Overlay:
  lines w7.87: -285.63,-56 -321.5,-56 cw(c-321.5,0) -321.5,56 -285.63,56 ; -272.5,-44.52 -272.5,44.52 ; -234.24,-85 287.5,-85 287.5,85 -234.24,85 ; 172.03,-85 172.03,-59.31 ; 172.03,59.31 172.03,85
Mechanical 8:
  lines w3.94: -280.19,-71.5 -260.5,-71.5 ; -280.19,71.5 -260.5,71.5 ; -260.5,-91.19 -260.5,-71.5 ; -260.5,-51.81 -260.5,-71.5 ; -260.5,51.81 -260.5,71.5 ; -260.5,91.19 -260.5,71.5 ; -240.82,-71.5 -260.5,-71.5 ; -240.82,71.5 -260.5,71.5 ; -186.19,0 -166.5,0 ; -166.5,-19.69 -166.5,0 ; -166.5,19.69 -166.5,0 ; -146.81,0 -166.5,0 ; -76.19,0 -56.5,0 ; -56.5,-19.69 -56.5,0 ; -56.5,19.69 -56.5,0 ; -36.81,0 -56.5,0 ; -19.68,0 0,0 ; 0,-19.68 0,0 ; 0,19.68 0,0 ; 19.68,0 0,0 ; 38.81,0 58.5,0 ; 58.5,-19.69 58.5,0 ; 58.5,19.69 58.5,0 ; 78.19,0 58.5,0 ; 148.81,0 168.5,0 ; 168.5,-19.69 168.5,0 ; 168.5,19.69 168.5,0 ; 188.19,0 168.5,0 ; 231.63,-50 251.31,-50 ; 231.63,50 251.31,50 ; 251.31,-69.69 251.31,-50 ; 251.31,-30.32 251.31,-50 ; 251.31,30.32 251.31,50 ; 251.31,69.69 251.31,50 ; 271,-50 251.31,-50 ; 271,50 251.31,50 ; -199,-47.5 -199,47.5 -134,47.5 -134,-47.5 -199,-47.5 ; -89,-47.5 -89,47.5 -24,47.5 -24,-47.5 -89,-47.5 ; 26,-47.5 26,47.5 91,47.5 91,-47.5 26,-47.5 ; 136,-47.5 136,47.5 201,47.5 201,-47.5 136,-47.5
Mechanical 14:
  lines w3.94: -272.5,-56 -321.5,-56 cw(c-321.5,0) -321.5,56 -272.5,56 ; 172.03,-85 172.03,85 ; -272.5,-85 -272.5,85 287.5,85 287.5,-85 -272.5,-85
3D body "LED_DIALIGHT_592-2626-0XXF.stp": height 390, standoff -40, extent -377.5,-85 287.5,85

## LED_DIALIGHT_592-3030-3XXF [mm] "3mm Bi-Level (Top: Red/Green, Bot: Red/Green) Prism CBI Bi-color Surface Mount LED 592 Serie"
height 10.54
pads (12):
  round 1 hole 1.1 unplated mask+0.05: 9(-6.615,-1.815) 9(-6.615,1.815) 9(6.415,-1.27) 9(6.415,1.27)
  rect 1.5x1.09 smd: B1(-1.355,-0.75) B2(-4.355,-0.75) B3(-1.355,0.75) B4(-4.355,0.75) T1(4.355,-0.75) T2(1.355,-0.75) T3(4.355,0.75) T4(1.355,0.75)
Top Overlay:
  lines w0.2: -7.287,-1.143 -8.446,-1.143 cw(c-8.446,0) -8.446,1.143 -7.287,1.143 ; -6.922,-0.916 -6.922,0.916 ; -5.729,-2.159 6.08,-2.159 ; -5.729,2.159 6.08,2.159 ; 4.382,-2.159 4.382,-1.695 ; 4.382,1.695 4.382,2.159 ; 6.75,-2.159 7.303,-2.159 7.303,-1.609 ; 6.75,2.159 7.303,2.159 7.303,1.609 ; 7.303,-0.931 7.303,0.931
Mechanical 8:
  circle w0.127: c-6.615,1.815 r0.55
  circle w0.127: c-6.615,-1.815 r0.55
  circle w0.127: c6.415,-1.27 r0.55
  circle w0.127: c6.415,1.27 r0.55
  lines w0.127: -7.115,-1.815 -6.615,-1.815 ; -7.115,1.815 -6.615,1.815 ; -6.615,-2.315 -6.615,-1.815 ; -6.615,-1.315 -6.615,-1.815 ; -6.615,1.315 -6.615,1.815 ; -6.615,2.315 -6.615,1.815 ; -6.115,-1.815 -6.615,-1.815 ; -6.115,1.815 -6.615,1.815 ; -4.855,-0.75 -4.355,-0.75 ; -4.855,0.75 -4.355,0.75 ; -4.355,-1.25 -4.355,-0.75 ; -4.355,-0.25 -4.355,-0.75 ; -4.355,0.25 -4.355,0.75 ; -4.355,1.25 -4.355,0.75 ; -3.855,-0.75 -4.355,-0.75 ; -3.855,0.75 -4.355,0.75 ; -3.355,0 -2.855,0 ; -2.855,-0.5 -2.855,0 ; -2.855,0.5 -2.855,0 ; -2.355,0 -2.855,0 ; -1.855,-0.75 -1.355,-0.75 ; -1.855,0.75 -1.355,0.75 ; -1.355,-1.25 -1.355,-0.75 ; -1.355,-0.25 -1.355,-0.75 ; -1.355,0.25 -1.355,0.75 ; -1.355,1.25 -1.355,0.75 ; -0.855,-0.75 -1.355,-0.75 ; -0.855,0.75 -1.355,0.75 ; 0,-0.5 0,0 ; 0,0.5 0,0 ; 0.855,-0.75 1.355,-0.75 ; 0.855,0.75 1.355,0.75 ; 1.355,-1.25 1.355,-0.75 ; 1.355,-0.25 1.355,-0.75 ; 1.355,0.25 1.355,0.75 ; 1.355,1.25 1.355,0.75 ; 1.855,-0.75 1.355,-0.75 ; 1.855,0.75 1.355,0.75 ; 2.355,0 2.855,0 ; 2.855,-0.5 2.855,0 ; 2.855,0.5 2.855,0 ; 3.355,0 2.855,0 ; 3.855,-0.75 4.355,-0.75 ; 3.855,0.75 4.355,0.75 ; 4.355,-1.25 4.355,-0.75 ; 4.355,-0.25 4.355,-0.75 ; 4.355,0.25 4.355,0.75 ; 4.355,1.25 4.355,0.75 ; 4.855,-0.75 4.355,-0.75 ; 4.855,0.75 4.355,0.75 ; 5.915,-1.27 6.415,-1.27 ; 5.915,1.27 6.415,1.27 ; 6.415,-1.77 6.415,-1.27 ; 6.415,-0.77 6.415,-1.27 ; 6.415,0.77 6.415,1.27 ; 6.415,1.77 6.415,1.27 ; 6.915,-1.27 6.415,-1.27 ; 6.915,1.27 6.415,1.27 ; 0,0 -0.5,0 0,0 ; 0,0 0.5,0 0,0 ; -5.105,-1.295 -3.605,-1.295 -3.605,-0.205 -5.105,-0.205 -5.105,-1.295 ; -5.105,0.205 -3.605,0.205 -3.605,1.295 -5.105,1.295 -5.105,0.205 ; -2.105,-1.295 -0.605,-1.295 -0.605,-0.205 -2.105,-0.205 -2.105,-1.295 ; -2.105,0.205 -0.605,0.205 -0.605,1.295 -2.105,1.295 -2.105,0.205 ; 0.605,-1.295 2.105,-1.295 2.105,-0.205 0.605,-0.205 0.605,-1.295 ; 0.605,0.205 2.105,0.205 2.105,1.295 0.605,1.295 0.605,0.205 ; 3.605,-1.295 5.105,-1.295 5.105,-0.205 3.605,-0.205 3.605,-1.295 ; 3.605,0.205 5.105,0.205 5.105,1.295 3.605,1.295 3.605,0.205
Mechanical 14:
  lines w0.1: -6.922,-1.143 -8.446,-1.143 cw(c-8.446,0) -8.446,1.143 -6.922,1.143 ; 4.382,-2.159 4.382,2.159 ; -6.922,-2.159 7.303,-2.159 7.303,2.159 -6.922,2.159 -6.922,-2.159
Mechanical 15:
  lines w0.05: -8.446,-1.393 cw(c-8.446,0) -8.446,1.393 -7.172,1.393 -7.172,2.409 7.553,2.409 7.553,-2.409 -7.172,-2.409 -7.172,-1.393 -8.446,-1.393
3D body "LED_DIALIGHT_592-3030-3XXF.stp": height 10.41, standoff -1.14, extent -9.588,-2.159 7.303,2.159

## LED_DIALIGHT_593-242424-0XXF [mm] "Yellow 3mm Tri-Level Prism CBI Surface Mount LED DIALIGHT 593 Serie"
height 15.08
pads (10):
  rect 1.651x2.413 smd: 1(-7.089,0) 2(-4.289,0) 3(-1.369,0) 4(1.431,0) 5(4.351,0) 6(7.151,0)
  round 1 hole 1.1 unplated mask+0.05: 7(-9.459,-1.815) 7(-9.459,1.815) 7(9.271,-1.27) 7(9.271,1.27)
Top Overlay:
  lines w0.2: -10.098,-1.422 -11.024,-1.422 cw(c-11.024,0) -11.024,1.422 -10.098,1.422 ; -9.779,-1.137 -9.779,1.137 ; -8.793,-2.159 10.16,-2.159 10.16,2.159 -8.793,2.159 ; 7.227,-2.159 7.227,-1.505 ; 7.227,1.505 7.227,2.159
Mechanical 8:
  lines w0.1: -9.959,-1.815 -9.459,-1.815 ; -9.959,1.815 -9.459,1.815 ; -9.459,-2.315 -9.459,-1.815 ; -9.459,-1.315 -9.459,-1.815 ; -9.459,1.315 -9.459,1.815 ; -9.459,2.315 -9.459,1.815 ; -8.959,-1.815 -9.459,-1.815 ; -8.959,1.815 -9.459,1.815 ; -7.589,0 -7.089,0 ; -7.089,-0.5 -7.089,0 ; -7.089,0.5 -7.089,0 ; -6.589,0 -7.089,0 ; -4.789,0 -4.289,0 ; -4.289,-0.5 -4.289,0 ; -4.289,0.5 -4.289,0 ; -3.789,0 -4.289,0 ; -1.869,0 -1.369,0 ; -1.369,-0.5 -1.369,0 ; -1.369,0.5 -1.369,0 ; -0.869,0 -1.369,0 ; -0.544,0 0.606,0 ; -0.5,0 0,0 ; 0,-0.5 0,0 ; 0,0.5 0,0 ; 0.5,0 0,0 ; 0.931,0 1.431,0 ; 1.431,-0.5 1.431,0 ; 1.431,0.5 1.431,0 ; 1.931,0 1.431,0 ; 3.851,0 4.351,0 ; 4.351,-0.5 4.351,0 ; 4.351,0.5 4.351,0 ; 4.851,0 4.351,0 ; 6.651,0 7.151,0 ; 7.151,-0.5 7.151,0 ; 7.151,0.5 7.151,0 ; 7.651,0 7.151,0 ; 8.771,-1.27 9.271,-1.27 ; 8.771,1.27 9.271,1.27 ; 9.271,-1.77 9.271,-1.27 ; 9.271,-0.77 9.271,-1.27 ; 9.271,0.77 9.271,1.27 ; 9.271,1.77 9.271,1.27 ; 9.771,-1.27 9.271,-1.27 ; 9.771,1.27 9.271,1.27 ; -7.914,-1.205 -7.914,1.205 -6.264,1.205 -6.264,-1.205 -7.914,-1.205 ; -5.114,-1.205 -5.114,1.205 -3.464,1.205 -3.464,-1.205 -5.114,-1.205 ; -2.194,-1.205 -2.194,1.205 -0.544,1.205 -0.544,-1.205 -2.194,-1.205 ; 0.606,-1.205 0.606,1.205 2.256,1.205 2.256,-1.205 0.606,-1.205 ; 3.526,-1.205 3.526,1.205 5.176,1.205 5.176,-1.205 3.526,-1.205 ; 6.326,-1.205 6.326,1.205 7.976,1.205 7.976,-1.205 6.326,-1.205
Mechanical 14:
  lines w0.1: -9.779,-1.422 -11.024,-1.422 cw(c-11.024,0) -11.024,1.422 -9.779,1.422 ; 7.227,-2.159 7.227,2.159 ; -9.779,-2.159 10.16,-2.159 10.16,2.159 -9.779,2.159 -9.779,-2.159
3D body "LED_DIALIGHT_593-242424-0XXF.stp": height 15.07, standoff -1, extent -12.446,-2.159 10.16,2.159

## LED_DIALIGHT_593-262626-0XXF [mm] "Blue 3mm Tri-Level Prism CBI Surface Mount LED DIALIGHT 593 Serie"
height 15.08
pads (10):
  rect 1.651x2.413 smd: 1(-7.089,0) 2(-4.289,0) 3(-1.369,0) 4(1.431,0) 5(4.351,0) 6(7.151,0)
  round 1 hole 1.1 unplated mask+0.05: 7(-9.459,-1.815) 7(-9.459,1.815) 7(9.271,-1.27) 7(9.271,1.27)
Top Overlay:
  lines w0.2: -10.098,-1.422 -11.024,-1.422 cw(c-11.024,0) -11.024,1.422 -10.098,1.422 ; -9.779,-1.137 -9.779,1.137 ; -8.793,-2.159 10.16,-2.159 10.16,2.159 -8.793,2.159 ; 7.227,-2.159 7.227,-1.505 ; 7.227,1.505 7.227,2.159
Mechanical 8:
  lines w0.1: -9.959,-1.815 -9.459,-1.815 ; -9.959,1.815 -9.459,1.815 ; -9.459,-2.315 -9.459,-1.815 ; -9.459,-1.315 -9.459,-1.815 ; -9.459,1.315 -9.459,1.815 ; -9.459,2.315 -9.459,1.815 ; -8.959,-1.815 -9.459,-1.815 ; -8.959,1.815 -9.459,1.815 ; -7.589,0 -7.089,0 ; -7.089,-0.5 -7.089,0 ; -7.089,0.5 -7.089,0 ; -6.589,0 -7.089,0 ; -4.789,0 -4.289,0 ; -4.289,-0.5 -4.289,0 ; -4.289,0.5 -4.289,0 ; -3.789,0 -4.289,0 ; -1.869,0 -1.369,0 ; -1.369,-0.5 -1.369,0 ; -1.369,0.5 -1.369,0 ; -0.869,0 -1.369,0 ; -0.544,0 0.606,0 ; -0.5,0 0,0 ; 0,-0.5 0,0 ; 0,0.5 0,0 ; 0.5,0 0,0 ; 0.931,0 1.431,0 ; 1.431,-0.5 1.431,0 ; 1.431,0.5 1.431,0 ; 1.931,0 1.431,0 ; 3.851,0 4.351,0 ; 4.351,-0.5 4.351,0 ; 4.351,0.5 4.351,0 ; 4.851,0 4.351,0 ; 6.651,0 7.151,0 ; 7.151,-0.5 7.151,0 ; 7.151,0.5 7.151,0 ; 7.651,0 7.151,0 ; 8.771,-1.27 9.271,-1.27 ; 8.771,1.27 9.271,1.27 ; 9.271,-1.77 9.271,-1.27 ; 9.271,-0.77 9.271,-1.27 ; 9.271,0.77 9.271,1.27 ; 9.271,1.77 9.271,1.27 ; 9.771,-1.27 9.271,-1.27 ; 9.771,1.27 9.271,1.27 ; -7.914,-1.205 -6.264,-1.205 -6.264,1.205 -7.914,1.205 -7.914,-1.205 ; -5.114,-1.205 -3.464,-1.205 -3.464,1.205 -5.114,1.205 -5.114,-1.205 ; -2.194,-1.205 -0.544,-1.205 -0.544,1.205 -2.194,1.205 -2.194,-1.205 ; 0.606,-1.205 2.256,-1.205 2.256,1.205 0.606,1.205 0.606,-1.205 ; 3.526,-1.205 5.176,-1.205 5.176,1.205 3.526,1.205 3.526,-1.205 ; 6.326,-1.205 7.976,-1.205 7.976,1.205 6.326,1.205 6.326,-1.205
Mechanical 14:
  lines w0.1: -9.779,-1.422 -11.024,-1.422 cw(c-11.024,0) -11.024,1.422 -9.779,1.422 ; 7.227,-2.159 7.227,2.159 ; -9.779,-2.159 -9.779,2.159 10.16,2.159 10.16,-2.159 -9.779,-2.159
3D body "LED_DIALIGHT_593-262626-0XXF.stp": height 15.07, standoff -1, extent -12.446,-2.159 10.16,2.159

## LED_DIALIGHT_597-2111-407F [mm] "SMT GaAlAs Red LED, Body 3x2mm, 1208 Case, DIALIGHT 597 Series"
height 1
pads (3):
  rect 1.5x1.5 smd: 1(-1.75,0) 2(1.75,0)
  rect 0.9x0.9 smd: 3(0,0.65)
Top Overlay:
  circle w0.25: c-1.75,1.3 r0.125
  lines w0.2: -0.65,-1.26 ccw(c0,-0.5) 0.65,-1.26 ; -0.65,-0.5 0.65,-0.5
Mechanical 8:
  lines w0.05: -2.25,0 -1.75,0 ; -1.75,-0.5 -1.75,0 ; -1.75,0.5 -1.75,0 ; -1.25,0 -1.75,0 ; -0.5,0 0,0 ; 0,-0.5 0,0 ; 0,0.5 0,0 ; 0.5,0 0,0 ; 1.25,0 1.75,0 ; 1.75,-0.5 1.75,0 ; 1.75,0.5 1.75,0 ; 2.25,0 1.75,0 ; -0.45,0.2 0,0.65 0.45,0.2 ; -0.45,0.2 0.45,0.2 ; -0.45,0.2 -0.45,1.1 0.45,1.1 0.45,0.2 ; -2.5,-0.75 -2.5,0.75 -1,0.75 -1,-0.75 -2.5,-0.75 ; 1,-0.75 1,0.75 2.5,0.75 2.5,-0.75 1,-0.75
Mechanical 14:
  lines w0.1: -1.25,-0.5 -1.25,-0.45 -1.45,-0.45 -1.45,0.45 -1.25,0.45 -1.25,0.5 ; -1,-0.5 ccw(c0,-0.5) 1,-0.5 ; 1.25,-0.5 1.25,-0.45 1.45,-0.45 1.45,0.45 1.25,0.45 1.25,0.5 ; -1.5,-0.5 1.5,-0.5 1.5,0.5 -1.5,0.5 -1.5,-0.5
Mechanical 15:
  lines w0.05: -2.75,-1 -1.146,-1 ccw(c0,-0.5) 1.146,-1 2.75,-1 2.75,1.35 -2.75,1.35 -2.75,-1
3D body "LED_DIALIGHT_597-2111-407F.stp": height 1, standoff 0, extent -1.5,-1.5 1.5,0.5